# Altium footprint library Tomra_Cadstar_Footprints.PcbLib: 373 footprints (part 19 of 24)
Each footprint in its own frame and in the unit in brackets; x right, y up, seen from the top. Pads: shape width x height; smd on the part's side, far side on the other; paste and mask are expansions set on the pad; w line width, h text height; cw(c..) or ccw(c..) is an arc to the next point about the centre after c.
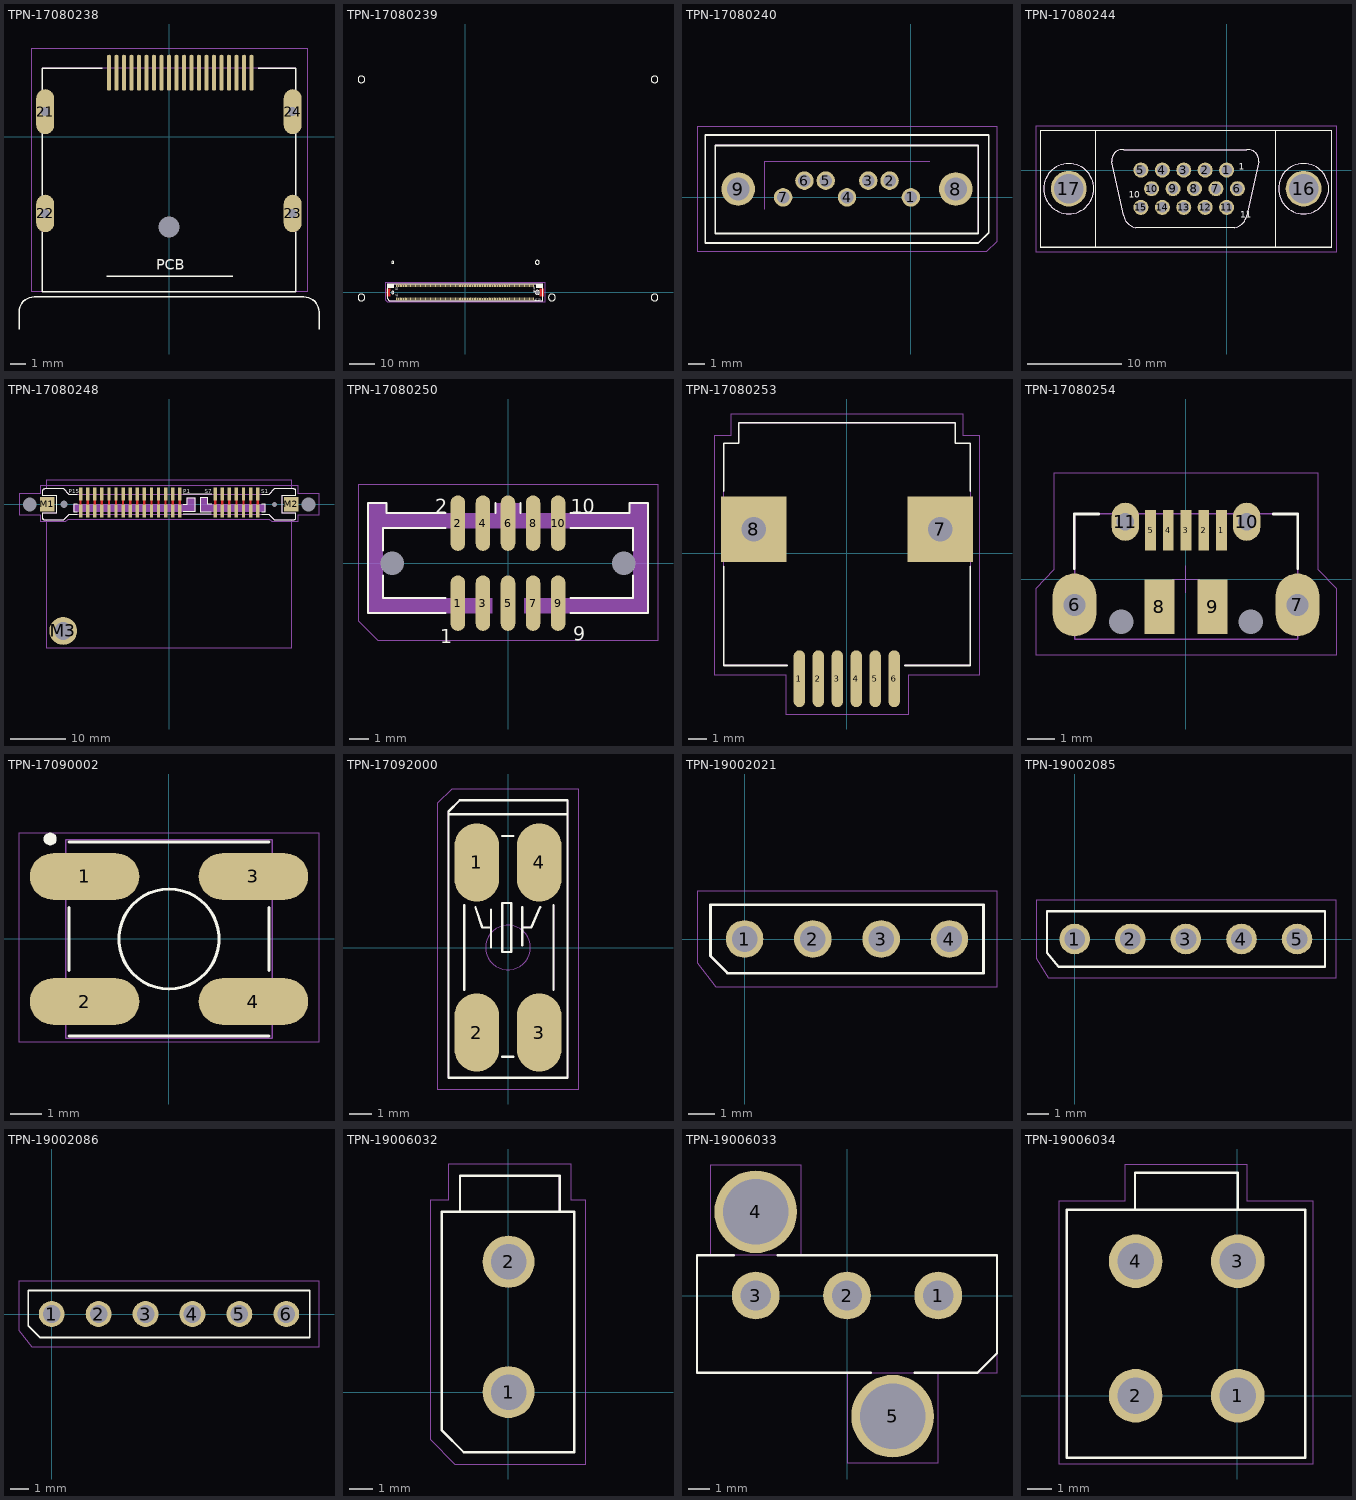
[diagram p18: the footprints below, top view; thin cyan lines are the x and y axes]

## TPN-17080238 [mm]
height 6.2
pads (25):
  oval 0.28x2.4 smd paste+0 mask+0: 1(5.5,4.25) 2(5,4.25) 3(4.5,4.25) 4(4,4.25) 5(3.5,4.25) 6(3,4.25) 7(2.5,4.25) 8(2,4.25) 9(1.5,4.25) 10(1,4.25) 11(0.5,4.25) 12(0,4.25) 13(-0.5,4.25) 14(-1,4.25) 15(-1.5,4.25) 16(-2,4.25) 17(-2.5,4.25) 18(-3,4.25) 19(-3.5,4.25) 20(-4,4.25)
  oval 1.2x3 / inner round 1.524 / far side oval 1.2x3 hole 0.6 paste+0 mask+0: 21(-8.25,1.65) 24(8.25,1.65)
  oval 1.2x2.5 / inner round 1.524 / far side oval 1.2x2.5 hole 0.6 paste+0 mask+0: 22(-8.25,-5.13) 23(8.25,-5.13)
  round 0 / inner round 1.524 / far side round 0 hole 1.4 unplated paste+0 mask+0: 25(0,-6.03)
Top Silk:
  lines w0.1: -10,-12.85 -10,-11.7 cw(c-9,-11.7) -9,-10.7 9,-10.7 cw(c9,-11.7) 10,-11.7 10,-12.85 ; -8.45,-6.35 -8.45,-10.34 8.45,-10.34 8.45,-6.35 8.45,-10.33 ; -8.45,-3.95 -8.45,0.25 ; -8.45,3.05 -8.45,4.55 -4.45,4.55 ; -4.135,-9.315 4.265,-9.315 ; 5.95,4.55 8.45,4.55 8.45,3.05 ; 8.45,-3.95 8.45,0.25
  text "PCB" at -0.84,-8.87 h0.7
  text ".Designator" at 0,0 h0.7
Top Assembly:
  lines w0.05: -8.45,-10.33 8.45,-10.33 8.45,4.55 -8.45,4.55 -8.45,-10.33
  text "1" at 5.95,2.75 h0.7
Top Placement:
  lines w0.01: -9.175,-10.33 9.24,-10.33 9.24,5.85 -9.175,5.85 -9.175,-10.33

## TPN-17080239 [mm]
height 8
pads (222):
  oval 0.45x1.21 smd paste+0 mask+0: A1(-27.35,-2.7) A110(27.3,-2.7) B1(-27.35,2.7) B110(27.3,2.7)
  oval 0.3x1.2 smd paste+0 mask+0: A2(-26.775,-2.7) A3(-26.275,-2.7) A4(-25.775,-2.7) A5(-25.275,-2.7) A6(-24.775,-2.7) A7(-24.275,-2.7) A8(-23.775,-2.7) A9(-23.275,-2.7) A10(-22.775,-2.7) A11(-22.275,-2.7) A12(-21.775,-2.7) A13(-21.275,-2.7) A14(-20.775,-2.7) A15(-20.275,-2.7) A16(-19.775,-2.7) A17(-19.275,-2.7) A18(-18.775,-2.7) A19(-18.275,-2.7) A20(-17.775,-2.7) A21(-17.275,-2.7) A22(-16.775,-2.7) A23(-16.275,-2.7) A24(-15.775,-2.7) A25(-15.275,-2.7) A26(-14.775,-2.7) A27(-14.275,-2.7) A28(-13.775,-2.7) A29(-13.275,-2.7) A30(-12.775,-2.7) A31(-12.275,-2.7) A32(-11.775,-2.7) A33(-11.275,-2.7) A34(-10.775,-2.7) A35(-10.275,-2.7) A36(-9.775,-2.7) A37(-9.275,-2.7) A38(-8.775,-2.7) A39(-8.275,-2.7) A40(-7.775,-2.7) A41(-7.275,-2.7) A42(-6.775,-2.7) A43(-6.275,-2.7) A44(-5.775,-2.7) A45(-5.275,-2.7) A46(-4.775,-2.7) A47(-4.275,-2.7) A48(-3.775,-2.7) A49(-3.275,-2.7) A50(-2.775,-2.7) A51(-2.275,-2.7) A52(-1.775,-2.7) A53(-1.275,-2.7) A54(-0.775,-2.7) A55(-0.275,-2.7) A56(0.225,-2.7) A57(0.725,-2.7) A58(1.225,-2.7) A59(1.725,-2.7) A60(2.225,-2.7) A61(2.725,-2.7) A62(3.225,-2.7) A63(3.725,-2.7) A64(4.225,-2.7) A65(4.725,-2.7) A66(5.225,-2.7) A67(5.725,-2.7) A68(6.225,-2.7) A69(6.725,-2.7) A70(7.225,-2.7) A71(7.725,-2.7) A72(8.225,-2.7) A73(8.725,-2.7) A74(9.225,-2.7) A75(9.725,-2.7) A76(10.225,-2.7) A77(10.725,-2.7) A78(11.225,-2.7) A79(11.725,-2.7) A80(12.225,-2.7) A81(12.725,-2.7) A82(13.225,-2.7) A83(13.725,-2.7) A84(14.225,-2.7) A85(14.725,-2.7) A86(15.225,-2.7) A87(15.725,-2.7) A88(16.225,-2.7) A89(16.725,-2.7) A90(17.225,-2.7) A91(17.725,-2.7) A92(18.225,-2.7) A93(18.725,-2.7) A94(19.225,-2.7) A95(19.725,-2.7) A96(20.225,-2.7) A97(20.725,-2.7) A98(21.225,-2.7) A99(21.725,-2.7) A100(22.225,-2.7) A101(22.725,-2.7) A102(23.225,-2.7) A103(23.725,-2.7) A104(24.225,-2.7) A105(24.725,-2.7) A106(25.225,-2.7) A107(25.725,-2.7) A108(26.225,-2.7) A109(26.725,-2.7) B2(-26.775,2.7) B3(-26.275,2.7) B4(-25.775,2.7) B5(-25.275,2.7) B6(-24.775,2.7) B7(-24.275,2.7) B8(-23.775,2.7) B9(-23.275,2.7) B10(-22.775,2.7) B11(-22.275,2.7) B12(-21.775,2.7) B13(-21.275,2.7) B14(-20.775,2.7) B15(-20.275,2.7) B16(-19.775,2.7) B17(-19.275,2.7) B18(-18.775,2.7) B19(-18.275,2.7) B20(-17.775,2.7) B21(-17.275,2.7) B22(-16.775,2.7) B23(-16.275,2.7) B24(-15.775,2.7) B25(-15.275,2.7) B26(-14.775,2.7) B27(-14.275,2.7) B28(-13.775,2.7) B29(-13.275,2.7) B30(-12.775,2.7) B31(-12.275,2.7) B32(-11.775,2.7) B33(-11.275,2.7) B34(-10.775,2.7) B35(-10.275,2.7) B36(-9.775,2.7) B37(-9.275,2.7) B38(-8.775,2.7) B39(-8.275,2.7) B40(-7.775,2.7) B41(-7.275,2.7) B42(-6.775,2.7) B43(-6.275,2.7) B44(-5.775,2.7) B45(-5.275,2.7) B46(-4.775,2.7) B47(-4.275,2.7) B48(-3.775,2.7) B49(-3.275,2.7) B50(-2.775,2.7) B51(-2.275,2.7) B52(-1.775,2.7) B53(-1.275,2.7) B54(-0.775,2.7) B55(-0.275,2.7) B56(0.225,2.7) B57(0.725,2.7) B58(1.225,2.7) B59(1.725,2.7) B60(2.225,2.7) B61(2.725,2.7) B62(3.225,2.7) B63(3.725,2.7) B64(4.225,2.7) B65(4.725,2.7) B66(5.225,2.7) B67(5.725,2.7) B68(6.225,2.7) B69(6.725,2.7) B70(7.225,2.7) B71(7.725,2.7) B72(8.225,2.7) B73(8.725,2.7) B74(9.225,2.7) B75(9.725,2.7) B76(10.225,2.7) B77(10.725,2.7) B78(11.225,2.7) B79(11.725,2.7) B80(12.225,2.7) B81(12.725,2.7) B82(13.225,2.7) B83(13.725,2.7) B84(14.225,2.7) B85(14.725,2.7) B86(15.225,2.7) B87(15.725,2.7) B88(16.225,2.7) B89(16.725,2.7) B90(17.225,2.7) B91(17.725,2.7) B92(18.225,2.7) B93(18.725,2.7) B94(19.225,2.7) B95(19.725,2.7) B96(20.225,2.7) B97(20.725,2.7) B98(21.225,2.7) B99(21.725,2.7) B100(22.225,2.7) B101(22.725,2.7) B102(23.225,2.7) B103(23.725,2.7) B104(24.225,2.7) B105(24.725,2.7) B106(25.225,2.7) B107(25.725,2.7) B108(26.225,2.7) B109(26.725,2.7)
  round 1.5 / inner round 1.524 / far side round 1.5 hole 1.5 unplated paste+0 mask+0: MTG1(28.85,0)
  round 0 / inner round 1.524 / far side round 0 hole 0.8 unplated paste+0 mask+0: MTG2(-28.85,0)
Top Elec:
  region: -31.3,-1.55 -29.85,-1.55 -29.85,-0.7 -29.897,-0.62 -29.973,-0.452 -30.025,-0.275 -30.051,-0.092 -30.051,0.092 -30.025,0.275 -29.973,0.452 -29.897,0.62 -29.85,0.7 -29.85,1.55 -31.3,1.55
  region: 31.35,1.55 29.9,1.55 29.9,0.7 29.947,0.62 30.023,0.452 30.075,0.275 30.101,0.092 30.101,-0.092 30.075,-0.275 30.023,-0.452 29.947,-0.62 29.9,-0.7 29.9,-1.55 31.35,-1.55
Top Silk:
  region: -31.1,1.9 -28.37,1.9 -28.37,3.3 -31.1,3.3
  region: 31.1,3.3 28.37,3.3 28.37,1.9 31.1,1.9
  lines w0.1: -41.35,-3.35 cw(c-41.35,-2) -41.35,-0.65 cw(c-41.35,-2) -41.35,-3.35 ; -41.35,83.65 cw(c-41.35,85) -41.35,86.35 cw(c-41.35,85) -41.35,83.65 ; -31.1,-2.4 -30.2,-3.3 31.1,-3.3 31.1,3.3 -31.1,3.3 -31.1,-2.4 ; -28.85,-0.45 cw(c-28.85,0) -28.85,0.45 cw(c-28.85,0) -28.85,-0.45 ; -28.85,11.55 cw(c-28.85,12) -28.85,12.45 cw(c-28.85,12) -28.85,11.55 ; 28.85,-0.8 cw(c28.85,0) 28.85,0.8 cw(c28.85,0) 28.85,-0.8 ; 28.85,11.2 cw(c28.85,12) 28.85,12.8 cw(c28.85,12) 28.85,11.2 ; 34.65,-3.35 cw(c34.65,-2) 34.65,-0.65 cw(c34.65,-2) 34.65,-3.35 ; 75.65,-3.35 cw(c75.65,-2) 75.65,-0.65 cw(c75.65,-2) 75.65,-3.35 ; 75.65,83.65 cw(c75.65,85) 75.65,86.35 cw(c75.65,85) 75.65,83.65
  text "B1" at -26.75,0.8 h0.7
  text "A1" at -26.75,-1.75 h0.7
  text "B110" at 28,-0.15 h0.7
  text "A110" at 27.85,-3.25 h0.7
  text ".Designator" at 0,0 h0.7
Top Paste:
  region: -31.3,-1.55 -29.85,-1.55 -29.85,-0.7 -29.897,-0.62 -29.973,-0.452 -30.025,-0.275 -30.051,-0.092 -30.051,0.092 -30.025,0.275 -29.973,0.452 -29.897,0.62 -29.85,0.7 -29.85,1.55 -31.3,1.55
  region: 31.35,1.55 29.9,1.55 29.9,0.7 29.947,0.62 30.023,0.452 30.075,0.275 30.101,0.092 30.101,-0.092 30.075,-0.275 30.023,-0.452 29.947,-0.62 29.9,-0.7 29.9,-1.55 31.35,-1.55
Top Solder Resist:
  region: -31.3,-1.55 -29.85,-1.55 -29.85,-0.7 -29.897,-0.62 -29.973,-0.452 -30.025,-0.275 -30.051,-0.092 -30.051,0.092 -30.025,0.275 -29.973,0.452 -29.897,0.62 -29.85,0.7 -29.85,1.55 -31.3,1.55
  region: 31.35,1.55 29.9,1.55 29.9,0.7 29.947,0.62 30.023,0.452 30.075,0.275 30.101,0.092 30.101,-0.092 30.075,-0.275 30.023,-0.452 29.947,-0.62 29.9,-0.7 29.9,-1.55 31.35,-1.55
Top Assembly:
  lines w0.05: -31.1,-2.4 -30.2,-3.3 31.1,-3.3 31.1,3.3 -31.1,3.3 -31.1,-2.4
Top Placement:
  lines w0.01: -31.85,-3 -31.05,-3.8 31.95,-3.8 31.95,3.8 -31.85,3.8 -31.85,-3

## TPN-17080240 [mm]
height 8.4
pads (9):
  round 1.1 / inner round 1.524 / far side round 1.1 hole 0.75 paste+0 mask+0: 1(0,0) 2(-1.27,1) 3(-2.54,1) 4(-3.81,0) 5(-5.08,1) 6(-6.35,1) 7(-7.62,0)
  round 2 / inner round 1.524 / far side round 2 hole 1.35 paste+0 mask+0: 8(2.68,0.5) 9(-10.3,0.5)
Top Silk:
  lines w0.1: -12.26,-2.725 4.03,-2.725 4.64,-2.115 4.64,3.725 -12.26,3.725 -12.26,-2.725 ; -11.67,-2.15 4.03,-2.15 4.03,3.1 -11.67,3.1 -11.67,-2.15
  text ".Designator" at 0,0 h0.7
Top Assembly:
  lines w0.05: -8.72,-0.7 -8.72,2.15 1.13,2.15 ; -12.26,-2.725 4.03,-2.725 4.64,-2.115 4.64,3.725 -12.26,3.725 -12.26,-2.725 ; -11.67,-2.15 4.03,-2.15 4.03,3.1 -11.67,3.1 -11.67,-2.15
Top Placement:
  lines w0.01: -12.76,-3.225 4.53,-3.225 5.14,-2.615 5.14,4.225 -12.76,4.225 -12.76,-3.225

## TPN-17080244 [mm]
height 12.5
pads (17):
  round 1.6 / inner round 1.524 / far side round 1.6 hole 1.1 paste+0 mask+0: 1(0,0) 2(-2.28,0) 3(-4.56,0) 4(-6.84,0) 5(-9.12,0) 6(1.14,-1.98) 7(-1.14,-1.98) 8(-3.42,-1.98) 9(-5.7,-1.98) 10(-7.98,-1.98) 11(0,-3.96) 12(-2.28,-3.96) 13(-4.56,-3.96) 14(-6.84,-3.96) 15(-9.12,-3.96)
  round 3.8 / inner round 1.524 / far side round 3.8 hole 3.15 paste+0 mask+0: 16(8.18,-1.98) 17(-16.788,-1.98)
Top Silk:
  lines w0.1: -19.772,4.24 11.127,4.24 ; -19.772,4.24 -19.772,-8.22 11.127,-8.22 11.127,4.24 ; -19.772,4.24 11.127,4.24 ; -19.772,4.24 -19.772,-8.27 11.127,-8.27 11.127,4.24 ; -16.788,-4.647 cw(c-16.788,-1.98) -16.788,0.687 ; -16.788,-4.647 ccw(c-16.788,-1.98) -16.788,0.687 ; -16.788,-4.647 cw(c-16.788,-1.98) -16.788,0.687 ; -16.788,-4.647 ccw(c-16.788,-1.98) -16.788,0.687 ; -13.93,-8.248 5.158,-8.248 ; -13.93,-8.248 -13.93,4.26 ; -13.93,-8.248 5.158,-8.248 ; -13.93,-8.248 -13.93,4.26 ; -13.93,4.26 5.158,4.26 ; -13.93,4.26 5.158,4.26 ; 5.158,-8.248 5.158,4.26 ; 5.158,-8.248 5.158,4.26 ; 8.18,-4.647 ccw(c8.18,-1.98) 8.18,0.687 ; 8.18,-4.647 cw(c8.18,-1.98) 8.18,0.687 ; 8.18,-4.647 ccw(c8.18,-1.98) 8.18,0.687 ; 8.18,-4.647 cw(c8.18,-1.98) 8.18,0.687 ; -12.226,0.875 -10.956,-4.84 ccw(c-9.369,-4.523) -9.686,-6.11 0.857,-6.11 ccw(c0.624,-4.607) 2.127,-4.84 3.397,0.875 ccw(c2.292,1.04) 2.127,2.145 -10.956,2.145 ccw(c-11.122,1.04) -12.226,0.875
  text "11" at 1.42,-5.08 h0.7
  text "10" at -10.42,-2.93 h0.7
  text "1" at 1.29,0.02 h0.7
  text ".Designator" at 0,0 h0.7
Top Assembly:
  lines w0.05: -19.772,-8.261 11.127,-8.261 11.127,4.24 -19.772,4.24 -19.772,-8.261 ; -16.788,-4.647 cw(c-16.788,-1.98) -16.788,0.687 cw(c-16.788,-1.98) -16.788,-4.647 ; -13.93,-8.248 5.158,-8.248 5.158,4.26 -13.93,4.26 -13.93,-8.248 ; -12.226,0.875 -10.956,-4.84 ccw(c-9.369,-4.523) -9.686,-6.11 0.857,-6.11 ccw(c0.624,-4.607) 2.127,-4.84 3.397,0.875 ccw(c2.292,1.04) 2.127,2.145 -10.956,2.145 ccw(c-11.122,1.04) -12.226,0.875 ; 8.18,-4.647 ccw(c8.18,-1.98) 8.18,0.687 ccw(c8.18,-1.98) 8.18,-4.647
  text "11" at 1.42,-5.08 h0.7
  text "D15-F-180" at -7.843,2.29 h0.7
  text "10" at -10.42,-2.93 h0.7
  text "1" at 1.29,0.02 h0.7
  text "HD-22" at -6.523,-8.1 h0.7
Top Placement:
  lines w0.01: -20.272,-8.761 11.627,-8.761 11.627,4.74 -20.272,4.74 -20.272,-8.761

## TPN-17080248 [mm]
height 8.4
pads (51):
  round 0 / inner round 1.524 / far side round 0 hole 1.3 unplated paste+0 mask+0: 26(-18.875,0)
  round 0 / inner round 1.524 / far side round 0 hole 0.9 unplated paste+0 mask+0: 27(18.875,0)
  rrect0% 0.6x2.35 smd paste+0 mask+0: 28(1.905,-1.175) 29(0.635,-1.175) 30(-0.635,-1.175) 31(-1.905,-1.175) 32(-3.175,-1.175) 33(-4.445,-1.175) 34(-5.715,-1.175) 35(-6.985,-1.175) 36(-8.255,-1.175) 37(-9.525,-1.175) 38(-10.795,-1.175) 39(-12.065,-1.175) 40(-13.335,-1.175) 41(-14.605,-1.175) 42(-15.875,-1.175) 43(15.875,-1.175) 44(14.605,-1.175) 45(13.335,-1.175) 46(12.065,-1.175) 47(10.795,-1.175) 48(9.525,-1.175) 49(8.255,-1.175) P1(1.905,1.825) P2(0.635,1.825) P3(-0.635,1.825) P4(-1.905,1.825) P5(-3.175,1.825) P6(-4.445,1.825) P7(-5.715,1.825) P8(-6.985,1.825) P9(-8.255,1.825) P10(-9.525,1.825) P11(-10.795,1.825) P12(-12.065,1.825) P13(-13.335,1.825) P14(-14.605,1.825) P15(-15.875,1.825) S1(15.875,1.825) S2(14.605,1.825) S3(13.335,1.825) S4(12.065,1.825) S5(10.795,1.825) S6(9.525,1.825) S7(8.255,1.825)
  round 0 / inner round 1.524 / far side round 0 hole 2.5 unplated paste+0 mask+0: 50(-25,0) 51(25,0)
  rect 2.6x2.6 smd paste+0 mask+0.1: M1(-21.875,0) M2(21.875,0)
  round 5 / inner round 1.524 / far side round 5 hole 3.2 paste+0 mask+0: M3(-19,-22.7)
Top Elec:
  lines w0.4: -15.875,-1.175 -15.875,1.825 ; -14.605,-1.175 -14.605,1.825 ; -13.335,-1.175 -13.335,1.825 ; -12.065,-1.175 -12.065,1.825 ; -10.795,-1.175 -10.795,1.825 ; -9.525,-1.175 -9.525,1.825 ; -8.255,-1.175 -8.255,1.825 ; -6.985,-1.175 -6.985,1.825 ; -5.715,-1.175 -5.715,1.825 ; -4.445,-1.175 -4.445,1.825 ; -3.175,-1.175 -3.175,1.825 ; -1.905,-1.175 -1.905,1.825 ; -0.635,-1.175 -0.635,1.825 ; 0.635,-1.175 0.635,1.825 ; 1.905,-1.175 1.905,1.825 ; 8.255,-1.175 8.255,1.825 ; 9.525,-1.175 9.525,1.825 ; 10.795,-1.175 10.795,1.825 ; 12.065,-1.175 12.065,1.825 ; 13.335,-1.175 13.335,1.825 ; 14.605,-1.175 14.605,1.825 ; 15.875,-1.175 15.875,1.825
Top Silk:
  lines w0.1: -16.5,-1.295 -17.125,-1.3 -17.125,0 -16.5,0 ; -16.495,-1.745 -17.875,-1.75 -18.875,-2.75 -22.35,-2.75 cw(c-22.35,-2.35) -22.75,-2.35 -22.75,-1.6 -20.275,-1.6 -20.275,1.6 -22.75,1.6 -22.75,2.35 cw(c-22.351,2.351) -22.35,2.75 -18.875,2.75 -17.875,1.75 -16.495,1.745 ; 2.55,-1.76 7.59,-1.76 ; 2.55,0 3.25,0 3.25,1.225 4.55,1.225 4.55,-1.3 2.555,-1.3 ; 2.56,1.765 7.64,1.765 ; 7.595,-1.3 5.6,-1.3 5.6,1.225 6.9,1.225 6.9,0 7.6,0 ; 16.565,-1.3 17.275,-1.3 17.275,0 16.59,0 ; 16.57,-1.75 17.87,-1.75 18.87,-2.75 22.345,-2.75 ccw(c22.353,-2.358) 22.745,-2.35 22.745,-1.6 20.27,-1.6 20.27,1.6 22.745,1.6 22.745,2.35 ccw(c22.357,2.363) 22.345,2.75 18.87,2.75 17.87,1.75 16.58,1.75
  text "S1" at 16.525,1.95 h0.7
  text "S7" at 6.4,1.95 h0.7
  text "P15" at -18,1.95 h0.7
  text "P1" at 2.525,1.95 h0.7
  text ".Designator" at 0,0 h0.7
Top Assembly:
  region: 4.55,-1.3 -17.125,-1.3 -17.125,0 3.25,0 3.25,1.225 4.55,1.225
  region: 5.6,-1.3 17.275,-1.3 17.275,0 6.9,0 6.9,1.225 5.6,1.225
  lines w0.05: -22.75,-2.35 ccw(c-22.35,-2.35) -22.35,-2.75 -18.875,-2.75 -17.875,-1.75 17.85,-1.75 18.85,-2.75 22.35,-2.75 ccw(c22.35,-2.35) 22.75,-2.35 22.75,-1.6 20.25,-1.6 20.25,1.6 22.75,1.6 22.75,2.35 ccw(c22.35,2.35) 22.35,2.75 18.85,2.75 17.85,1.75 -17.875,1.75 -18.875,2.75 -22.35,2.75 ccw(c-22.35,2.35) -22.75,2.35 -22.75,1.6 -20.275,1.6 -20.275,-1.6 -22.75,-1.6 -22.75,-2.35
  lines w0.1: -22,-2.97 -22,-25.7 22,-25.7 22,-2.925 ; -22,2.875 -22,4.3 21.995,4.3 21.995,2.905
  text "P1" at 2.525,1.95 h0.7
  text "P15" at -18,1.95 h0.7
  text "S7" at 6.4,1.95 h0.7
  text "S1" at 16.525,1.95 h0.7
Top Placement:
  lines w0.01: -26.925,-1.875 -26.925,1.925 -23.125,1.925 -23.125,3.325 23.175,3.325 23.175,1.925 26.875,1.925 26.875,-1.875 23.175,-1.875 23.175,-3.075 18.375,-3.075 17.975,-2.675 -18.125,-2.675 -18.525,-3.075 -23.125,-3.075 -23.125,-1.875 -26.925,-1.875 ; -22.75,-2.35 ccw(c-22.35,-2.35) -22.35,-2.75 -18.875,-2.75 -17.875,-1.75 17.85,-1.75 18.85,-2.75 22.35,-2.75 ccw(c22.35,-2.35) 22.75,-2.35 22.75,-1.6 20.25,-1.6 20.25,1.6 22.75,1.6 22.75,2.35 ccw(c22.35,2.35) 22.35,2.75 18.85,2.75 17.85,1.75 -17.875,1.75 -18.875,2.75 -22.35,2.75 ccw(c-22.35,2.35) -22.75,2.35 -22.75,1.6 -20.275,1.6 -20.275,-1.6 -22.75,-1.6 -22.75,-2.35 ; -17.125,-1.3 4.55,-1.3 4.55,1.225 3.25,1.225 3.25,0 -17.125,0 -17.125,-1.3

## TPN-17080250 [mil]
height 216.54
pads (12):
  oval 29x111 smd paste+0 mask+0: 1(-100,-80) 2(-100,80) 3(-50,-80) 4(-50,80) 5(0,-80) 6(0,80) 7(50,-80) 8(50,80) 9(100,-80) 10(100,80)
  round 0 / inner round 60 / far side round 0 hole 47.24 unplated paste+0 mask+0: 11(-231,0) 12(231,0)
Top Silk:
  lines w3.94: -250,-25 -250,-70 -125,-70 ; -250,25 -250,70 -125,70 ; -125,-100 -280,-100 -280,120 -243,120 -243,100 -125,100 ; -25,100 -25,120 ; 25,100 25,120 ; 125,-100 280,-100 280,120 243,120 243,100 125,100 ; 125,-70 250,-70 250,-25 ; 125,70 250,70 250,25
  text "1" at -135,-160 h27.56
  text "2" at -145,100 h27.56
  text "10" at 125,100 h27.56
  text "9" at 130,-155 h27.56
  text ".Designator" at 0,0 h27.56
Top Assembly:
  region: 32.25,-70 32.25,-100 280,-100 280,120 243,120 243,100 25,100 25,120 -25,120 -25,100 -243,100 -243,120 -280,120 -280,-100 -31.6,-100 -31.6,-69.95 -250,-69.95 -250,70 250,70 250,-70
  text "1" at -135,-160 h27.56
  text "2" at -145,100 h27.56
  text "10" at 125,100 h27.56
  text "9" at 130,-155 h27.56
Top Placement:
  lines w0.39: -299.69,-115.04 -260.31,-154.41 299.69,-154.41 299.69,156.61 -299.69,156.61 -299.69,-115.04
  text "1" at -135,-160 h27.56
  text "2" at -145,100 h27.56
  text "10" at 125,100 h27.56
  text "9" at 130,-155 h27.56

## TPN-17080253 [mm]
height 12.5
pads (8):
  oval 0.61x3.05 smd paste+0 mask+0: 1(-2.552,-6.712) 2(-1.536,-6.712) 3(-0.52,-6.712) 4(0.496,-6.712) 5(1.512,-6.712) 6(2.528,-6.712)
  rect 3.505x3.505 / inner round 1.524 / far side round 1.75 hole 1.3 paste+0 mask+0.102: 7(5,1.3) 8(-5,1.3)
Top Silk:
  lines w0.1: -6.6,-0.7 -6.6,-6 -3.2,-6 ; -6.6,3.35 -6.6,5.9 -5.8,5.9 -5.8,7 5.8,7 5.8,5.9 6.6,5.9 6.6,3.35 ; 3.1,-6 6.6,-6 6.6,-0.7
  text ".Designator" at 0,0 h0.7
Top Assembly:
  lines w0.05: -3.2,-6 -6.6,-6 -6.6,5.9 -5.8,5.9 -5.8,7 5.8,7 5.8,5.9 6.6,5.9 6.6,-6 3.1,-6
Top Placement:
  lines w0.01: -7.1,-6.5 -3.29,-6.5 -3.29,-8.6 3.3,-8.6 3.3,-6.5 7.1,-6.5 7.1,6.315 6.239,6.315 6.235,7.47 -6.239,7.47 -6.239,6.315 -7.1,6.315 -7.1,-6.5

## TPN-17080254 [mm]
height 2.75
pads (13):
  rect 0.4x1.5 smd paste+0 mask+0: 1(1.3,1.8) 2(0.65,1.8) 3(0,1.8) 4(-0.65,1.8) 5(-1.3,1.8)
  oval 1.6x2.3 / inner round 1.524 / far side oval 1.6x2.3 hole 0.8 paste+0 mask+0: 6(-4.088,-0.938) 7(4.088,-0.938)
  rect 1.1x2 smd paste+0 mask+0: 8(-0.975,-1) 9(0.975,-1)
  oval 1x1.4 / inner round 1.524 / far side oval 1x1.4 hole 0.65 unplated paste+0 mask+0: 10(2.225,2.112) 11(-2.225,2.112)
  round 0 / inner round 1.524 / far side round 0 hole 0.9 unplated paste+0 mask+0: 12(-2.375,-1.55) 13(2.375,-1.55)
Top Silk:
  lines w0.1: -4.1,0.4 -4.1,2.4 -3.2,2.4 ; 3.2,2.4 4.1,2.4 4.1,0.4
  text ".Designator" at 0,0 h0.7
Top Assembly:
  lines w0.05: -4.088,-2.2 4.1,-2.2 4.1,2.4 -4.088,2.4 -4.088,-2.2
Top Placement:
  lines w0.01: -0.5,0 0.5,0 ; 0,-0.5 0,0.5 ; -5.5,-2.775 5.5,-2.775 5.5,-0.334 4.84,0.371 4.84,3.9 -4.84,3.9 -4.84,0.371 -5.5,-0.334 -5.5,-2.775

## TPN-17090002 [mm]
height 3.2
pads (4):
  oval 3.5x1.5 smd paste+0 mask+0: 1(-2.7,2) 2(-2.7,-2) 3(2.7,2) 4(2.7,-2)
Top Silk:
  region: -3.8,3 -3.84,3 -3.913,3.03 -3.97,3.087 -4,3.16 -4,3.24 -3.97,3.313 -3.913,3.37 -3.84,3.4 -3.8,3.4 -3.76,3.4 -3.687,3.37 -3.63,3.313 -3.6,3.24 -3.6,3.16 -3.63,3.087 -3.687,3.03 -3.76,3
  lines w0.1: -3.2,-3.1 3.2,-3.1 ; -3.2,-1 -3.2,1 ; -3.2,3.1 3.2,3.1 ; 3.2,-1 3.2,1 ; 0,-1.6 cw(c0,0) 0,1.6 cw(c0,0) 0,-1.6
  text ".Designator" at -3.599,-0.35 h0.7
Top Assembly:
  lines w0.05: -3.302,-3.175 3.302,-3.175 3.302,3.175 -3.302,3.175 -3.302,-3.175 ; 0,-1.6 cw(c0,0) 0,1.6 cw(c0,0) 0,-1.6
Top Placement:
  lines w0.01: -4.8,-3.3 4.8,-3.3 4.8,3.4 -4.8,3.4 -4.8,-3.3

## TPN-17092000 [mm]
height 2.5
pads (4):
  oval 2x3.5 smd paste+0 mask+0: 1(-1.397,3.81) 2(-1.397,-3.81) 3(1.397,-3.81) 4(1.397,3.81)
Top Silk:
  lines w0.1: -1.957,-1.9 -1.957,1.9 ; -1.457,1.8 -1.157,0.9 -0.757,0.9 ; -0.757,0 -0.757,1.7 ; -0.257,-4.9 0.243,-4.9 ; -0.257,5 0.243,5 ; 0.643,0.1 0.643,1.8 ; 0.643,0.9 1.043,0.9 1.443,1.8 ; 2.043,-1.9 2.043,1.9 ; -2.667,6.1 -2.163,6.604 ; -2.667,6.1 -2.667,-5.842 2.667,-5.842 2.667,6.604 ; -2.667,6.1 -2.667,5.969 2.667,5.969 2.667,6.604 ; -2.667,6.1 -2.163,6.604 ; -2.163,6.604 2.667,6.604 ; -2.163,6.604 2.667,6.604 ; -0.257,-0.2 0.143,-0.2 0.143,2 -0.257,2 -0.257,-0.2
  text ".Designator" at -0.219,3.624 h0.7
Drill:
  lines w0.05: -1,0 cw(c0,0) 1,0 cw(c0,0) -1,0
Top Assembly:
  lines w0.05: -1.957,-1.9 -1.957,1.9 ; -1.457,1.8 -1.157,0.9 -0.757,0.9 ; -0.757,0 -0.757,1.7 ; -0.257,-4.9 0.243,-4.9 ; -0.257,5 0.243,5 ; 0.643,0.1 0.643,1.8 ; 0.643,0.9 1.043,0.9 1.443,1.8 ; 2.043,-1.9 2.043,1.9 ; -2.667,6.1 -2.667,5.969 2.667,5.969 2.667,6.604 ; -2.667,6.1 -2.163,6.604 ; -2.667,6.1 -2.163,6.604 ; -2.667,6.1 -2.667,-5.842 2.667,-5.842 2.667,6.604 ; -2.163,6.604 2.667,6.604 ; -2.163,6.604 2.667,6.604 ; -0.257,-0.2 0.143,-0.2 0.143,2 -0.257,2 -0.257,-0.2
Top Placement:
  lines w0.01: -3.167,-6.342 3.167,-6.342 3.167,7.104 -2.519,7.104 -3.167,6.456 -3.167,-6.342

## TPN-19002021 [mm]
height 9
pads (4):
  round 1.4 / inner round 1.524 / far side round 1.4 hole 0.95 paste+0 mask+0: 1(0,0) 2(2.54,0) 3(5.08,0) 4(7.62,0)
Top Silk:
  lines w0.1: -1.27,-0.635 -0.635,-1.27 8.89,-1.27 8.89,1.27 -1.27,1.27 -1.27,-0.635
  text ".Designator" at 0,0 h0.7
Top Assembly:
  lines w0.05: -1.27,-0.635 -0.635,-1.27 8.89,-1.27 8.89,1.27 -1.27,1.27 -1.27,-0.635
Top Placement:
  lines w0.01: -1.77,-0.885 -1.072,-1.77 9.39,-1.77 9.39,1.77 -1.77,1.77 -1.77,-0.885

## TPN-19002085 [mm]
height 9
pads (5):
  round 1.4 / inner round 1.524 / far side round 1.4 hole 0.95 paste+0 mask+0: 1(0,0) 2(2.54,0) 3(5.08,0) 4(7.62,0) 5(10.16,0)
Top Silk:
  lines w0.1: -1.27,-0.635 -0.74,-1.27 11.44,-1.27 11.44,1.27 -1.27,1.27 -1.27,-0.635
  text ".Designator" at 0,0 h0.7
Top Assembly:
  lines w0.05: -1.27,-0.635 -0.74,-1.27 11.44,-1.27 11.44,1.27 -1.27,1.27 -1.27,-0.635
Top Placement:
  lines w0.01: -1.77,-0.885 -1.199,-1.77 11.94,-1.77 11.94,1.77 -1.77,1.77 -1.77,-0.885

## TPN-19002086 [mm]
height 9
pads (6):
  round 1.4 / inner round 1.524 / far side round 1.4 hole 0.95 paste+0 mask+0: 1(0,0) 2(2.54,0) 3(5.08,0) 4(7.62,0) 5(10.16,0) 6(12.7,0)
Top Silk:
  lines w0.1: -1.27,-0.635 -0.635,-1.27 13.97,-1.27 13.97,1.27 -1.27,1.27 -1.27,-0.635
  text ".Designator" at 0,0 h0.7
Top Assembly:
  lines w0.05: -1.27,-0.635 -0.635,-1.27 13.97,-1.27 13.97,1.27 -1.27,1.27 -1.27,-0.635
Top Placement:
  lines w0.01: -1.77,-0.885 -1.093,-1.77 14.47,-1.77 14.47,1.77 -1.77,1.77 -1.77,-0.885

## TPN-19006032 [mm]
height 13
pads (2):
  round 2.2 / inner round 1.524 / far side round 2.2 hole 1.5 paste+0 mask+0: 1(0.025,0) 2(0.025,5.512)
Top Silk:
  lines w0.1: -2.794,-1.619 -1.873,-2.54 2.794,-2.54 2.794,7.62 -2.794,7.62 -2.794,-1.619 ; -2.032,7.62 2.184,7.62 2.184,9.144 -2.032,9.144 -2.032,7.62
  text ".Designator" at 0,0 h0.7
Top Assembly:
  lines w0.05: -2.794,-1.619 -1.873,-2.54 2.794,-2.54 2.794,7.62 -2.794,7.62 -2.794,-1.619 ; -2.032,7.62 2.159,7.62 2.159,9.144 -2.032,9.144 -2.032,7.62
Top Placement:
  lines w0.01: -3.294,-2 -2.254,-3.04 3.294,-3.04 3.294,8.12 2.684,8.12 2.684,9.644 -2.532,9.644 -2.532,8.12 -3.294,8.12 -3.294,-2

## TPN-19006033 [mm]
height 13
pads (5):
  round 2.2 / inner round 1.524 / far side round 2.2 hole 1.4 paste+0 mask+0: 1(4.2,0) 2(0,0) 3(-4.2,0)
  round 3.8 / inner round 1.524 / far side round 3.8 hole 3 paste+0 mask+0: 4(-4.2,3.85) 5(2.1,-5.55)
Top Silk:
  lines w0.1: -5.2,1.85 -6.9,1.85 -6.9,-3.55 1.1,-3.55 ; -3.2,1.85 6.9,1.85 6.9,-2.65 6,-3.55 3.1,-3.55
  text ".Designator" at -1.15,2.8 h0.7
Top Assembly:
  lines w0.05: -6.9,-3.55 6,-3.55 6.9,-2.65 6.9,1.85 -6.9,1.85 -6.9,-3.55
Top Placement:
  lines w0.01: -6.9,-3.55 -6.9,1.85 -6.3,1.85 -6.3,6 -2.1,6 -2.1,1.85 6.9,1.85 6.9,-3.55 4.2,-3.55 4.2,-7.7 0,-7.7 0,-3.55 -6.9,-3.55

## TPN-19006034 [mm]
height 12.8
pads (4):
  round 2.2 / inner round 1.524 / far side round 2.2 hole 1.5 paste+0 mask+0: 1(0.025,0) 2(-4.166,0) 3(0.025,5.512) 4(-4.166,5.512)
Top Silk:
  lines w0.1: -6.985,-2.54 2.794,-2.54 ; -6.985,-2.54 -6.985,7.62 ; -6.985,-2.54 2.794,-2.54 ; -6.985,-2.54 -6.985,7.62 ; -6.985,7.62 2.794,7.62 ; -6.985,7.62 2.794,7.62 ; -4.191,7.62 0.025,7.62 ; -4.191,7.62 -4.191,9.144 ; -4.191,7.62 0.025,7.62 ; -4.191,7.62 -4.191,9.144 ; -4.191,9.144 0.025,9.144 ; -4.191,9.144 0.025,9.144 ; 0.025,7.62 0.025,9.144 ; 0.025,7.62 0.025,9.144 ; 2.794,-2.54 2.794,7.62 ; 2.794,-2.54 2.794,7.62
  text ".Designator" at -7.3,8 h0.7
Top Assembly:
  lines w0.05: -6.985,-2.54 2.794,-2.54 2.794,7.62 -6.985,7.62 -6.985,-2.54 ; -4.191,7.62 0.025,7.62 0.025,9.144 -4.191,9.144 -4.191,7.62
Top Placement:
  lines w0.01: -7.3,-2.8 3.1,-2.8 3.1,8 0.4,8 0.4,9.5 -4.6,9.5 -4.6,8 -7.3,8 -7.3,-2.8